# Altium footprint library EXTRA.PcbLib: 19 footprints (part 1 of 2)
Each footprint in its own frame and in the unit in brackets; x right, y up, seen from the top. Pads: shape width x height; smd on the part's side, far side on the other; paste and mask are expansions set on the pad; w line width, h text height; cw(c..) or ccw(c..) is an arc to the next point about the centre after c.
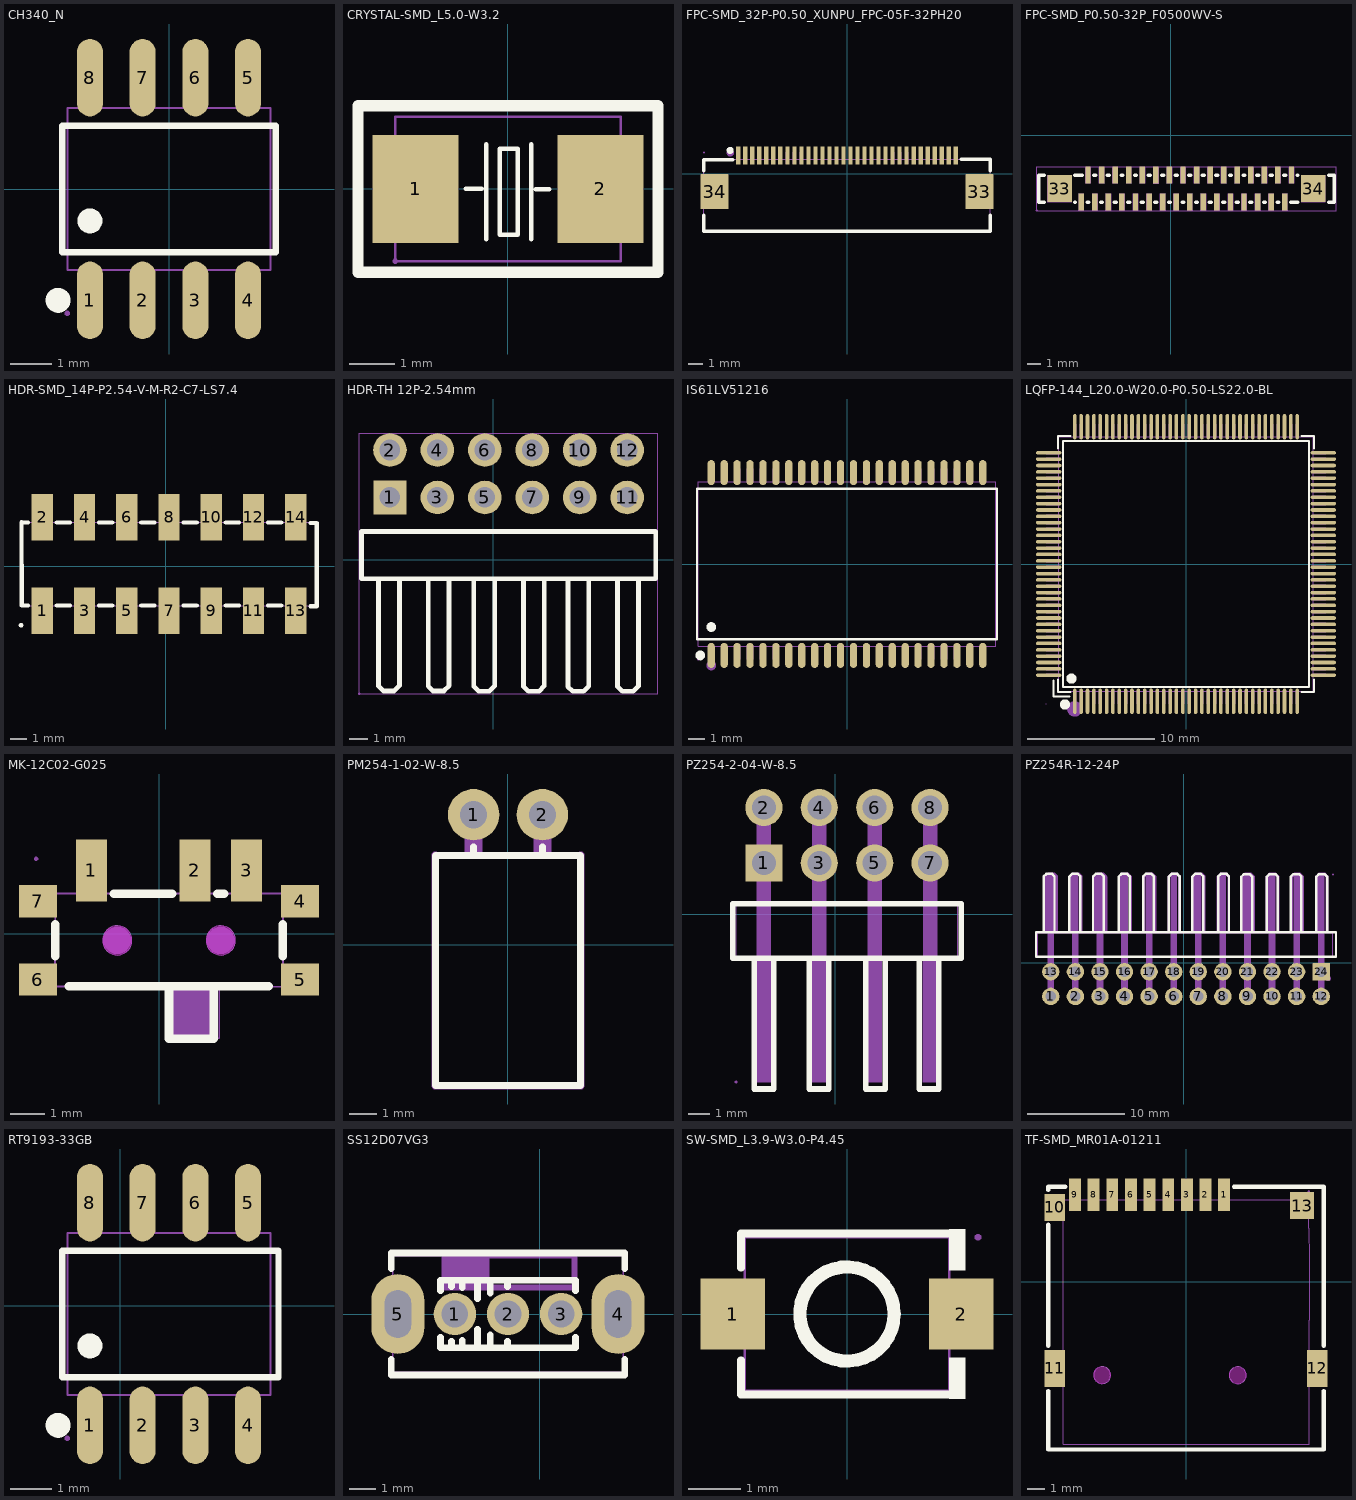
[diagram p0: the footprints below, top view; thin cyan lines are the x and y axes]

## CH340_N [mm] "USB转串口小封装芯片"
pads (8):
  oval 0.63x1.865 smd: 1(-1.905,-2.682) 2(-0.635,-2.682) 3(0.635,-2.682) 4(1.905,-2.682) 5(1.905,2.682) 6(0.635,2.682) 7(-0.635,2.682)
  oval 0.63x1.865 smd mask+0.102: 8(-1.905,2.682)
Top Overlay:
  circle w0.3: c-1.905,-0.769 r0.15
  circle w0.3: c-2.672,-2.682 r0.15
  lines w0.152: -2.576,-1.521 -2.576,1.521 2.576,1.521 2.576,-1.521 -2.576,-1.521
Mechanical 15:
  region: -2.39,-3 -2.39,-2.975 -2.425,-2.94 -2.475,-2.94 -2.51,-2.975 -2.51,-3 -2.51,-3.025 -2.475,-3.06 -2.425,-3.06 -2.39,-3.025
  region: 1.695,1.94 1.695,2.175 2.115,2.175 2.115,1.94
  region: 1.695,2.165 1.695,3 2.115,3 2.115,2.165
  region: 0.425,1.94 0.425,2.175 0.845,2.175 0.845,1.94
  region: 0.425,2.165 0.425,3 0.845,3 0.845,2.165
  region: -0.845,1.94 -0.845,2.175 -0.425,2.175 -0.425,1.94
  region: -0.845,2.165 -0.845,3 -0.425,3 -0.425,2.165
  region: -2.115,1.94 -2.115,2.175 -1.695,2.175 -1.695,1.94
  region: -2.115,2.165 -2.115,3 -1.695,3 -1.695,2.165
  region: 1.695,-2.175 1.695,-1.94 2.115,-1.94 2.115,-2.175
  region: 1.695,-3 1.695,-2.165 2.115,-2.165 2.115,-3
  region: 0.425,-2.175 0.425,-1.94 0.845,-1.94 0.845,-2.175
  region: 0.425,-3 0.425,-2.165 0.845,-2.165 0.845,-3
  region: -0.845,-2.175 -0.845,-1.94 -0.425,-1.94 -0.425,-2.175
  region: -0.845,-3 -0.845,-2.165 -0.425,-2.165 -0.425,-3
  region: -2.115,-2.175 -2.115,-1.94 -1.695,-1.94 -1.695,-2.175
  region: -2.115,-3 -2.115,-2.165 -1.695,-2.165 -1.695,-3
  lines w0.051: -2.45,-1.95 -2.45,1.95 2.45,1.95 2.45,-1.95 -2.45,-1.95
3D body "123.stp": height 1.67, standoff -0.05, extent -2.425,-2.94 2.39,3.06

## CRYSTAL-SMD_L5.0-W3.2 [mm] "8M 贴片晶振"
pads (2):
  rect 1.9x2.4 smd: 1(-2.05,0) 2(2.05,0)
Top Overlay:
  lines w0.1: -0.94,0 -0.584,0 ; -0.483,-1.109 -0.483,0.991 ; 0.517,-1.109 0.517,0.991 ; 0.617,-0.009 0.917,-0.009 ; -0.183,-1.009 0.217,-1.009 0.217,0.89 -0.183,0.89 -0.183,-1.009
  lines w0.254: -3.325,-1.85 -3.325,-0.7 -3.325,0.7 -3.325,1.85 3.325,1.85 3.325,0.7 3.325,-0.7 3.325,-1.85 -3.325,-1.85
Mechanical 15:
  region: 1.3,1 2.4,1 2.4,-1 1.3,-1
  region: -2.4,1 -1.3,1 -1.3,-1 -2.4,-1
  region: -2.44,-1.6 -2.44,-1.575 -2.475,-1.54 -2.525,-1.54 -2.56,-1.575 -2.56,-1.6 -2.56,-1.625 -2.525,-1.66 -2.475,-1.66 -2.44,-1.625
  lines w0.051: -2.5,-1.6 2.5,-1.6 2.5,1.6 -2.5,1.6 -2.5,-1.6
3D body "X1.stp": height 1.41, standoff -0.01, extent -2.5,-1.6 2.5,1.6

## FPC-SMD_32P-P0.50_XUNPU_FPC-05F-32PH20 [mm] "32pin FPC排线 弯针"
pads (34):
  rect 0.3x1.25 smd paste+0 mask+0.05: 1(-7.75,1.288) 2(-7.25,1.288) 3(-6.75,1.288) 4(-6.25,1.288) 5(-5.75,1.288) 6(-5.25,1.288) 7(-4.75,1.288) 8(-4.25,1.288) 9(-3.75,1.288) 10(-3.25,1.288) 11(-2.75,1.288) 12(-2.25,1.288) 13(-1.75,1.288) 14(-1.25,1.288) 15(-0.75,1.288) 16(-0.25,1.288) 17(0.25,1.288) 18(0.75,1.288) 19(1.25,1.288) 20(1.75,1.288) 21(2.25,1.288) 22(2.75,1.288) 23(3.25,1.288) 24(3.75,1.288) 25(4.25,1.288) 26(4.75,1.288) 27(5.25,1.288) 28(5.75,1.288) 29(6.25,1.288) 30(6.75,1.288) 31(7.25,1.288) 32(7.75,1.288)
  rect 2x2.5 smd paste+0 mask+0.05: 33(9.44,-1.288) 34(-9.44,-1.288)
Top Overlay:
  circle w0.254: c-8.327,1.651 r0.127
  lines w0.254: -10.2,-2.969 -10.2,-4.113 10.2,-4.113 10.2,-2.969 ; -10.2,0.194 -10.2,1 -8.131,1 ; 8.131,1.016 10.2,1.016 10.2,0.194
Mechanical 6:
  circle w0.254: c-8.317,1.471 r0.127
Mechanical 15:
  drawing of 39 lines, arcs and shapes, not listed
3D body "FPC.stp": height 2.01, standoff 0, extent -10.2,-4.113 10.2,1.287

## FPC-SMD_P0.50-32P_F0500WV-S [mm] "FPC_32PIN 直立"
height 0.508
pads (34):
  rect 0.4x1.25 smd paste+0 mask+0.051: 1(-6.607,-4.938) 2(-6.109,-2.936) 3(-5.609,-4.936) 4(-5.109,-2.936) 5(-4.609,-4.936) 6(-4.109,-2.936) 7(-3.609,-4.936) 8(-3.109,-2.936) 9(-2.609,-4.936) 10(-2.109,-2.936) 11(-1.609,-4.936) 12(-1.107,-2.938) 13(-0.609,-4.936) 14(-0.109,-2.936) 15(0.391,-4.936) 16(0.891,-2.936) 17(1.391,-4.936) 18(1.891,-2.936) 19(2.391,-4.936) 20(2.891,-2.936) 21(3.391,-4.936) 22(3.891,-2.936) 23(4.393,-4.938) 24(4.891,-2.936) 25(5.391,-4.936) 26(5.891,-2.936) 27(6.393,-4.938) 28(6.891,-2.936) 29(7.391,-4.936) 30(7.891,-2.936) 31(8.391,-4.936) 32(8.891,-2.936)
  rect 1.8x2 smd paste+0 mask+0.051: 33(-8.207,-3.938) 34(10.493,-3.938)
Top Overlay:
  lines w0.254: -9.338,-4.938 -9.757,-4.938 -9.757,-2.938 -9.338,-2.938 ; -7.076,-4.938 -7.038,-4.938 ; -7.076,-2.938 -6.54,-2.938 ; -6.176,-4.938 -6.04,-4.938 ; -5.678,-2.938 -5.54,-2.938 ; -5.178,-4.938 -5.04,-4.938 ; -4.678,-2.938 -4.54,-2.938 ; -4.178,-4.938 -4.04,-4.938 ; -3.678,-2.938 -3.54,-2.938 ; -3.178,-4.938 -3.04,-4.938 ; -2.678,-2.938 -2.54,-2.938 ; -2.178,-4.938 -2.04,-4.938 ; -1.678,-2.938 -1.538,-2.938 ; -1.178,-4.938 -1.04,-4.938 ; -0.676,-2.938 -0.54,-2.938 ; -0.178,-4.938 -0.04,-4.938 ; 0.322,-2.938 0.46,-2.938 ; 0.822,-4.938 0.96,-4.938 ; 1.322,-2.938 1.46,-2.938 ; 1.822,-4.938 1.96,-4.938 ; 2.322,-2.938 2.46,-2.938 ; 2.822,-4.938 2.96,-4.938 ; 3.322,-2.938 3.46,-2.938 ; 3.822,-4.938 3.962,-4.938 ; 4.322,-2.938 4.46,-2.938 ; 4.824,-4.938 4.96,-4.938 ; 5.322,-2.938 5.46,-2.938 ; 5.822,-4.938 5.962,-4.938 ; 6.322,-2.938 6.46,-2.938 ; 6.824,-4.938 6.96,-4.938 ; 7.322,-2.938 7.46,-2.938 ; 7.822,-4.938 7.96,-4.938 ; 8.322,-2.938 8.46,-2.938 ; 8.822,-4.938 9.362,-4.938 ; 9.322,-2.938 9.362,-2.938 ; 11.624,-4.938 12.043,-4.938 12.043,-2.938 11.624,-2.938
Mechanical 15:
  drawing of 39 lines, arcs and shapes, not listed

## HDR-SMD_14P-P2.54-V-M-R2-C7-LS7.4 [mm] "2.54mm 2x7p贴片排针"
pads (14):
  rect 1.27x2.8 smd paste+0 mask+0.05: 1(-7.433,-2.664) 2(-7.433,2.936) 3(-4.893,-2.664) 4(-4.893,2.936) 5(-2.353,-2.664) 6(-2.353,2.936) 7(0.187,-2.664) 8(0.187,2.936) 9(2.727,-2.664) 10(2.727,2.936) 11(5.267,-2.664) 12(5.267,2.936) 13(7.807,-2.664) 14(7.807,2.936)
Top Overlay:
  lines w0.254: -8.726,-3.547 -8.68,-3.547 ; -8.678,2.651 -8.673,-2.364 -8.299,-2.364 ; -8.673,2.651 -8.573,2.636 -8.299,2.636 ; -6.567,-2.364 -5.759,-2.364 ; -6.567,2.636 -5.759,2.636 ; -4.027,-2.364 -3.219,-2.364 ; -4.027,2.636 -3.219,2.636 ; -1.487,-2.364 -0.679,-2.364 ; -1.487,2.636 -0.679,2.636 ; 1.053,-2.364 1.861,-2.364 ; 1.053,2.636 1.861,2.636 ; 3.593,-2.364 4.401,-2.364 ; 3.593,2.636 4.401,2.636 ; 6.133,-2.364 6.941,-2.364 ; 6.133,2.636 6.941,2.636 ; 8.695,-2.403 9.076,-2.403 9.076,2.596 8.695,2.596
Mechanical 15:
  region: -8.643,-3.564 -8.643,-3.539 -8.678,-3.504 -8.728,-3.504 -8.763,-3.539 -8.763,-3.564 -8.763,-3.589 -8.728,-3.624 -8.678,-3.624 -8.643,-3.589
  region: -7.753,3.836 -7.113,3.836 -7.113,1.836 -7.753,1.836
  region: -5.213,3.836 -4.573,3.836 -4.573,1.836 -5.213,1.836
  region: -2.673,3.836 -2.033,3.836 -2.033,1.836 -2.673,1.836
  region: -0.133,3.836 0.507,3.836 0.507,1.836 -0.133,1.836
  region: 2.407,3.836 3.047,3.836 3.047,1.836 2.407,1.836
  region: 4.947,3.836 5.587,3.836 5.587,1.836 4.947,1.836
  region: 7.487,3.836 8.127,3.836 8.127,1.836 7.487,1.836
  region: 7.487,-1.564 8.127,-1.564 8.127,-3.564 7.487,-3.564
  region: 4.947,-1.564 5.587,-1.564 5.587,-3.564 4.947,-3.564
  region: 2.407,-1.564 3.047,-1.564 3.047,-3.564 2.407,-3.564
  region: -0.133,-1.564 0.507,-1.564 0.507,-3.564 -0.133,-3.564
  region: -2.673,-1.564 -2.033,-1.564 -2.033,-3.564 -2.673,-3.564
  region: -5.213,-1.564 -4.573,-1.564 -4.573,-3.564 -5.213,-3.564
  region: -7.753,-1.564 -7.113,-1.564 -7.113,-3.564 -7.753,-3.564
  lines w0.051: -8.703,-2.364 -8.703,2.636 9.077,2.636 9.077,-2.364 -8.703,-2.364

## HDR-TH 12P-2.54mm [mm] "上下6p弯曲排针"
pads (12):
  rect 1.778x1.8 hole 1.1: 1(-5.528,3.328)
  round 1.8 hole 1.1: 2(-5.528,5.868) 3(-2.988,3.328) 4(-2.988,5.868) 5(-0.448,3.328) 6(-0.448,5.868) 7(2.092,3.328) 8(2.092,5.868) 9(4.632,3.328) 10(4.632,5.868) 11(7.172,3.328) 12(7.172,5.868)
Top Overlay:
  lines w0.254: -6.135,-1.032 -6.135,-6.778 -5.881,-7.032 -5.297,-7.032 -5.018,-6.753 -5.018,-1.032 ; -3.478,-1.032 -3.478,-6.778 -3.224,-7.032 -2.64,-7.032 -2.36,-6.753 -2.36,-1.032 ; -1.038,-1.042 -1.038,-6.788 -0.784,-7.042 -0.2,-7.042 0.08,-6.763 0.08,-1.042 ; 1.62,-1.042 1.62,-6.788 1.874,-7.042 2.458,-7.042 2.737,-6.763 2.737,-1.042 ; 4.002,-1.052 4.002,-6.798 4.256,-7.052 4.84,-7.052 5.12,-6.773 5.12,-1.052 ; 6.659,-1.052 6.659,-6.798 6.913,-7.052 7.498,-7.052 7.777,-6.773 7.777,-1.052 ; -7.052,-1.032 -6.958,-1.032 8.696,-1.032 8.696,1.508 -7.052,1.508 -7.052,-1.032
Mechanical 15:
  drawing of 17 lines, arcs and shapes, not listed

## IS61LV51216 [mm] "TSOP-44_L18.4-W10.2-P0.80-LS11.8-BL"
pads (44):
  oval 0.448x1.551 smd: 1(-8.4,-5.656) 2(-7.6,-5.656) 3(-6.8,-5.656) 4(-6,-5.656) 5(-5.2,-5.656) 6(-4.4,-5.656) 7(-3.6,-5.656) 8(-2.8,-5.656) 9(-2,-5.656) 10(-1.2,-5.656) 11(-0.4,-5.656) 12(0.4,-5.656) 13(1.2,-5.656) 14(2,-5.656) 15(2.8,-5.656) 16(3.6,-5.656) 17(4.4,-5.656) 18(5.2,-5.656) 19(6,-5.656) 20(6.8,-5.656) 21(7.6,-5.656) 22(8.4,-5.656) 23(8.4,5.656) 24(7.6,5.656) 25(6.8,5.656) 26(6,5.656) 27(5.2,5.656) 28(4.4,5.656) 29(3.6,5.656) 30(2.8,5.656) 31(2,5.656) 32(1.2,5.656) 33(0.4,5.656) 34(-0.4,5.656) 35(-1.2,5.656) 36(-2,5.656) 37(-2.8,5.656) 38(-3.6,5.656) 39(-4.4,5.656) 40(-5.2,5.656) 41(-6,5.656) 42(-6.8,5.656) 43(-7.6,5.656) 44(-8.4,5.656)
Top Overlay:
  circle w0.3: c-9.076,-5.656 r0.15
  circle w0.3: c-8.4,-3.899 r0.15
  lines w0.152: -9.281,-4.651 9.281,-4.651 9.281,4.651 -9.281,4.651 -9.281,-4.651
Mechanical 6:
  circle w0.3: c-8.4,-6.28 r0.15
Mechanical 15:
  drawing of 93 lines, arcs and shapes, not listed
3D body "SRAM.stp": height 1.1, standoff 0, extent -9.205,-5.906 9.195,5.906

## LQFP-144_L20.0-W20.0-P0.50-LS22.0-BL [mm] "意法半导体主控芯片"
pads (144):
  oval 0.28x2 smd paste+0 mask+0.051: 1(-8.75,-10.8) 2(-8.25,-10.8) 3(-7.75,-10.8) 4(-7.25,-10.8) 5(-6.75,-10.8) 6(-6.25,-10.8) 7(-5.75,-10.8) 8(-5.25,-10.8) 9(-4.75,-10.8) 10(-4.25,-10.8) 11(-3.75,-10.8) 12(-3.25,-10.8) 13(-2.75,-10.8) 14(-2.25,-10.8) 15(-1.75,-10.8) 16(-1.25,-10.8) 17(-0.75,-10.8) 18(-0.25,-10.8) 19(0.25,-10.8) 20(0.75,-10.8) 21(1.25,-10.8) 22(1.75,-10.8) 23(2.25,-10.8) 24(2.75,-10.8) 25(3.25,-10.8) 26(3.75,-10.8) 27(4.25,-10.8) 28(4.75,-10.8) 29(5.25,-10.8) 30(5.75,-10.8) 31(6.25,-10.8) 32(6.75,-10.8) 33(7.25,-10.8) 34(7.75,-10.8) 35(8.25,-10.8) 36(8.75,-10.8) 73(8.75,10.8) 74(8.25,10.8) 75(7.75,10.8) 76(7.25,10.8) 77(6.75,10.8) 78(6.25,10.8) 79(5.75,10.8) 80(5.25,10.8) 81(4.75,10.8) 82(4.25,10.8) 83(3.75,10.8) 84(3.25,10.8) 85(2.75,10.8) 86(2.25,10.8) 87(1.75,10.8) 88(1.25,10.8) 89(0.75,10.8) 90(0.25,10.8) 91(-0.25,10.8) 92(-0.75,10.8) 93(-1.25,10.8) 94(-1.75,10.8) 95(-2.25,10.8) 96(-2.75,10.8) 97(-3.25,10.8) 98(-3.75,10.8) 99(-4.25,10.8) 100(-4.75,10.8) 101(-5.25,10.8) 102(-5.75,10.8) 103(-6.25,10.8) 104(-6.75,10.8) 105(-7.25,10.8) 106(-7.75,10.8) 107(-8.25,10.8) 108(-8.75,10.8)
  oval 2x0.28 smd paste+0 mask+0.051: 37(10.8,-8.75) 38(10.8,-8.25) 39(10.8,-7.75) 40(10.8,-7.25) 41(10.8,-6.75) 42(10.8,-6.25) 43(10.8,-5.75) 44(10.8,-5.25) 45(10.8,-4.75) 46(10.8,-4.25) 47(10.8,-3.75) 48(10.8,-3.25) 49(10.8,-2.75) 50(10.8,-2.25) 51(10.8,-1.75) 52(10.8,-1.25) 53(10.8,-0.75) 54(10.8,-0.25) 55(10.8,0.25) 56(10.8,0.75) 57(10.8,1.25) 58(10.8,1.75) 59(10.8,2.25) 60(10.8,2.75) 61(10.8,3.25) 62(10.8,3.75) 63(10.8,4.25) 64(10.8,4.75) 65(10.8,5.25) 66(10.8,5.75) 67(10.8,6.25) 68(10.8,6.75) 69(10.8,7.25) 70(10.8,7.75) 71(10.8,8.25) 72(10.8,8.75) 109(-10.8,8.75) 110(-10.8,8.25) 111(-10.8,7.75) 112(-10.8,7.25) 113(-10.8,6.75) 114(-10.8,6.25) 115(-10.8,5.75) 116(-10.8,5.25) 117(-10.8,4.75) 118(-10.8,4.25) 119(-10.8,3.75) 120(-10.8,3.25) 121(-10.8,2.75) 122(-10.8,2.25) 123(-10.8,1.75) 124(-10.8,1.25) 125(-10.8,0.75) 126(-10.8,0.25) 127(-10.8,-0.25) 128(-10.8,-0.75) 129(-10.8,-1.25) 130(-10.8,-1.75) 131(-10.8,-2.25) 132(-10.8,-2.75) 133(-10.8,-3.25) 134(-10.8,-3.75) 135(-10.8,-4.25) 136(-10.8,-4.75) 137(-10.8,-5.25) 138(-10.8,-5.75) 139(-10.8,-6.25) 140(-10.8,-6.75) 141(-10.8,-7.25) 142(-10.8,-7.75) 143(-10.8,-8.25) 144(-10.8,-8.75)
Top Overlay:
  circle w0.4: c-9.525,-11.049 r0.2
  circle w0.4: c-9.017,-9.017 r0.2
  lines w0.152: -10.414,-9.144 -10.414,-10.414 -9.144,-10.414 ; -10.076,-9.081 -10.076,-10.076 -9.08,-10.076 ; -10.076,9.08 -10.076,10.076 -9.08,10.076 ; 9.081,-10.076 10.076,-10.076 10.076,-9.081 ; 9.081,10.076 10.076,10.076 10.076,9.08 ; -9.671,-9.671 -9.671,9.671 9.671,9.671 9.671,-9.671 -9.671,-9.671
Mechanical 6:
  circle w0.6: c-8.75,-11.4 r0.3
Mechanical 15:
  drawing of 293 lines, arcs and shapes, not listed
3D body "456.stp": height 1.4, standoff -0.1, extent -11.026,-11.01 10.974,10.99

## MK-12C02-G025 [mm] "贴片拨动开关"
pads (7):
  rect 0.9x1.8 smd: 1(-1.964,1.835) 2(1.036,1.835) 3(2.536,1.835)
  rect 1.1x0.93 smd: 4(4.086,0.939) 5(4.086,-1.331) 6(-3.514,-1.331) 7(-3.514,0.939)
Top Overlay:
  lines w0.254: -3.014,-0.658 -3.014,0.266 ; -2.614,-1.524 3.175,-1.524 ; -1.306,1.154 0.378,1.154 ; 0.286,-1.546 0.286,-3.046 1.586,-3.046 1.586,-1.546 ; 1.694,1.154 1.878,1.154 ; 3.586,-0.658 3.586,0.266
Keep-Out Layer:
  board cut-out: -0.789,-0.196 -0.789,-0.112 -0.854,0.044 -0.973,0.164 -1.13,0.229 -1.299,0.229 -1.455,0.164 -1.574,0.044 -1.639,-0.112 -1.639,-0.196 -1.639,-0.281 -1.574,-0.437 -1.455,-0.557 -1.299,-0.621 -1.129,-0.621 -0.973,-0.557 -0.854,-0.437 -0.789,-0.281
  board cut-out: 2.211,-0.196 2.211,-0.112 2.146,0.044 2.027,0.164 1.87,0.229 1.701,0.229 1.545,0.164 1.426,0.044 1.361,-0.112 1.361,-0.196 1.361,-0.281 1.426,-0.437 1.545,-0.557 1.701,-0.621 1.87,-0.621 2.027,-0.557 2.146,-0.437 2.211,-0.281
Mechanical 1:
  circle w0.005: c-1.214,-0.196 r0.425
  circle w0.005: c1.786,-0.196 r0.425
Mechanical 6:
  circle w0.4: c1.786,-0.196 r0.2
  circle w0.4: c-1.214,-0.196 r0.2
  region: 0.386,-1.548 0.386,-3.048 1.686,-3.048 1.686,-1.548
Mechanical 15:
  region: 3.542,-1.546 3.542,-1.116 4.142,-1.116 4.142,-1.546
  region: 3.542,0.724 3.542,1.154 4.142,1.154 4.142,0.724
  region: -3.567,-1.546 -3.567,-1.116 -2.967,-1.116 -2.967,-1.546
  region: -3.567,0.724 -3.567,1.154 -2.967,1.154 -2.967,0.724
  region: 2.736,0.965 2.336,0.965 2.336,2.165 2.736,2.165
  region: 1.236,0.965 0.836,0.965 0.836,2.165 1.236,2.165
  region: -1.764,0.965 -2.164,0.965 -2.164,2.165 -1.764,2.165
  region: -3.507,2.165 -3.507,2.189 -3.542,2.223 -3.591,2.223 -3.626,2.189 -3.627,2.165 -3.626,2.141 -3.591,2.107 -3.542,2.107 -3.507,2.141
  lines w0.051: -3.017,-1.537 -3.017,-1.372 -3.014,1.165 3.591,1.165 3.591,-1.541 1.743,-1.541 1.743,-3.037 0.445,-3.037 0.445,-1.537 -3.017,-1.537
Multi-Layer keep-out:
  region: -0.789,-0.196 -0.789,-0.112 -0.854,0.044 -0.973,0.164 -1.13,0.229 -1.299,0.229 -1.455,0.164 -1.574,0.044 -1.639,-0.112 -1.639,-0.196 -1.639,-0.281 -1.574,-0.437 -1.455,-0.557 -1.299,-0.621 -1.129,-0.621 -0.973,-0.557 -0.854,-0.437 -0.789,-0.281
  region: 2.211,-0.196 2.211,-0.112 2.146,0.044 2.027,0.164 1.87,0.229 1.701,0.229 1.545,0.164 1.426,0.044 1.361,-0.112 1.361,-0.196 1.361,-0.281 1.426,-0.437 1.545,-0.557 1.701,-0.621 1.87,-0.621 2.027,-0.557 2.146,-0.437 2.211,-0.281
3D body "MK.stp": height 1.4, standoff -0.5, extent -3.469,-2.78 4.231,2.42

## PM254-1-02-W-8.5 [mm] "2p 弯针"
pads (2):
  round 1.9 hole 1 paste+0 mask+0.05: 1(-1.257,4.793) 2(1.283,4.793)
Top Overlay:
  lines w0.254: -1.257,3.293 -1.257,3.612 ; -2.667,-5.207 2.693,-5.207 2.693,3.293 -2.667,3.293 -2.667,-5.207 ; 1.283,3.293 1.283,3.612 1.283,3.293
Mechanical 6:
  region: -2.667,-5.08 2.693,-5.08 2.746,-5.08 2.82,-5.154 2.82,-5.26 2.746,-5.334 2.693,-5.334 -2.667,-5.334 -2.72,-5.334 -2.794,-5.26 -2.794,-5.154 -2.72,-5.08
  region: 2.82,3.293 2.82,-5.207 2.82,-5.26 2.746,-5.334 2.64,-5.334 2.566,-5.26 2.566,-5.207 2.566,3.293 2.566,3.346 2.64,3.42 2.746,3.42 2.82,3.346
  region: -2.54,3.293 -2.54,-5.207 -2.54,-5.26 -2.614,-5.334 -2.72,-5.334 -2.794,-5.26 -2.794,-5.207 -2.794,3.293 -2.794,3.346 -2.72,3.42 -2.614,3.42 -2.54,3.346
Mechanical 15:
  region: -2.667,-5.207 -2.667,-5.182 -2.702,-5.147 -2.752,-5.147 -2.787,-5.182 -2.787,-5.207 -2.787,-5.232 -2.752,-5.267 -2.702,-5.267 -2.667,-5.232
  region: 1.603,4.993 0.963,4.993 0.963,3.283 1.603,3.283
  region: -0.937,4.993 -1.577,4.993 -1.577,3.283 -0.937,3.283
  region: -1.577,4.993 -0.937,4.993 -0.937,4.593 -1.577,4.593
  region: 0.963,4.993 1.603,4.993 1.603,4.593 0.963,4.593
  lines w0.051: -2.727,-5.207 -2.727,3.293 2.753,3.293 2.753,-5.207 -2.727,-5.207
3D body "3333D_.stp": height 2.5, standoff -3.2, extent -2.745,-5.149 2.745,5.001

## PZ254-2-04-W-8.5 [mm] "2.54mm 2x4p 弯针"
pads (8):
  rect 1.7x1.7 hole 1.1 paste+0 mask+0.05: 1(-3.279,2.359)
  round 1.7 hole 1.1 paste+0 mask+0.05: 2(-3.279,4.899) 3(-0.739,2.359) 4(-0.739,4.899) 5(1.801,2.359) 6(1.801,4.899) 7(4.341,2.359) 8(4.341,4.899)
Top Overlay:
  lines w0.254: -3.723,-2.001 -3.723,-8.001 -2.829,-8.001 -2.829,-2.001 ; -1.209,-2.001 -1.209,-8.001 -0.314,-8.001 -0.314,-2.001 ; 1.382,-2.001 1.382,-8.001 2.277,-8.001 2.277,-2.001 ; 3.846,-2.001 3.846,-8.001 4.74,-8.001 4.74,-2.001 ; -4.699,-2.001 5.761,-2.001 5.761,0.499 -4.699,0.499 -4.699,-2.001
Mechanical 6:
  region: 4.004,-2.044 4.658,-2.044 4.658,-7.698 4.004,-7.698
  region: 1.464,-2.044 2.118,-2.044 2.118,-7.698 1.464,-7.698
  region: -1.076,-2.044 -0.422,-2.044 -0.422,-7.698 -1.076,-7.698
  region: -3.616,-2.044 -2.962,-2.044 -2.962,-7.698 -3.616,-7.698
Mechanical 15:
  region: -4.489,-7.681 -4.489,-7.656 -4.524,-7.621 -4.574,-7.621 -4.609,-7.656 -4.609,-7.681 -4.609,-7.706 -4.574,-7.741 -4.524,-7.741 -4.489,-7.706
  region: 4.021,5.219 4.661,5.219 4.661,4.579 4.021,4.579
  region: 4.021,2.679 4.661,2.679 4.661,2.039 4.021,2.039
  region: 1.481,5.219 2.121,5.219 2.121,4.579 1.481,4.579
  region: 1.481,2.679 2.121,2.679 2.121,2.039 1.481,2.039
  region: -1.059,5.219 -0.419,5.219 -0.419,4.579 -1.059,4.579
  region: -1.059,2.679 -0.419,2.679 -0.419,2.039 -1.059,2.039
  region: -3.599,5.219 -2.959,5.219 -2.959,4.579 -3.599,4.579
  region: -3.599,2.679 -2.959,2.679 -2.959,2.039 -3.599,2.039
  region: 4.021,-7.681 4.021,5.219 4.661,5.219 4.661,-7.681
  region: 1.481,-7.681 1.481,5.219 2.121,5.219 2.121,-7.681
  region: -1.059,-7.681 -1.059,5.219 -0.419,5.219 -0.419,-7.681
  region: -3.599,-7.681 -3.599,5.219 -2.959,5.219 -2.959,-7.681
  lines w0.051: -4.549,-2.001 -4.549,0.499 5.611,0.499 5.611,-2.001 -4.549,-2.001
3D body "2x4p.stp": height 5, standoff -3, extent -4.572,-7.567 5.598,5.333

## PZ254R-12-24P [mm] "2X12P 弯针"
pads (24):
  round 1.8 hole 1.1: 1(-13.716,-3.476) 2(-11.176,-3.476) 3(-8.636,-3.476) 4(-6.096,-3.476) 5(-3.556,-3.476) 6(-1.016,-3.476) 7(1.524,-3.476) 8(4.064,-3.476) 9(6.604,-3.476) 10(9.144,-3.476) 11(11.684,-3.476) 12(14.224,-3.476) 13(-13.716,-0.936) 14(-11.176,-0.936) 15(-8.636,-0.936) 16(-6.096,-0.936) 17(-3.556,-0.936) 18(-1.016,-0.936) 19(1.524,-0.936) 20(4.064,-0.936) 21(6.604,-0.936) 22(9.144,-0.936) 23(11.684,-0.936)
  rect 1.778x1.8 hole 1.1: 24(14.224,-0.936)
Top Overlay:
  lines w0.254: -14.449,3.174 -14.449,8.894 -14.169,9.174 -13.585,9.174 -13.331,8.92 -13.331,3.174 ; -11.791,3.174 -11.791,8.894 -11.512,9.174 -10.928,9.174 -10.674,8.92 -10.674,3.174 ; -9.351,3.164 -9.351,8.885 -9.072,9.164 -8.487,9.164 -8.233,8.91 -8.233,3.164 ; -6.694,3.164 -6.694,8.885 -6.414,9.164 -5.83,9.164 -5.576,8.91 -5.576,3.164 ; -4.179,3.174 -4.179,8.894 -3.899,9.174 -3.315,9.174 -3.061,8.92 -3.061,3.174 ; -1.521,3.174 -1.521,8.894 -1.242,9.174 -0.658,9.174 -0.404,8.92 -0.404,3.174 ; 0.919,3.164 0.919,8.885 1.198,9.164 1.783,9.164 2.037,8.91 2.037,3.164 ; 3.576,3.164 3.576,8.885 3.856,9.164 4.44,9.164 4.694,8.91 4.694,3.164 ; 5.959,3.154 5.959,8.875 6.238,9.154 6.822,9.154 7.076,8.9 7.076,3.154 ; 8.616,3.154 8.616,8.875 8.896,9.154 9.48,9.154 9.734,8.9 9.734,3.154 ; 11.056,3.144 11.056,8.864 11.336,9.144 11.92,9.144 12.174,8.89 12.174,3.144 ; 13.714,3.144 13.714,8.864 13.993,9.144 14.577,9.144 14.831,8.89 14.831,3.144 ; -15.24,0.604 15.748,0.604 15.748,3.144 15.654,3.144 -15.24,3.144 -15.24,0.604
Mechanical 6:
  drawing of 13 lines, arcs and shapes, not listed
Mechanical 15:
  drawing of 41 lines, arcs and shapes, not listed
3D body "2x12p.stp": height 5, standoff -3, extent -15.09,-3.903 15.4,8.997

## RT9193-33GB [mm] "5vת3v3-LDOоƬ"
pads (8):
  oval 0.63x1.865 smd: 1(-0.734,-2.878) 2(0.536,-2.878) 3(1.806,-2.878) 4(3.076,-2.878) 5(3.076,2.487) 6(1.806,2.487) 7(0.536,2.487)
  oval 0.63x1.865 smd mask+0.102: 8(-0.734,2.487)
Top Overlay:
  circle w0.3: c-1.501,-2.878 r0.15
  circle w0.3: c-0.734,-0.964 r0.15
  lines w0.152: -1.405,-1.716 3.81,-1.716 3.81,1.326 -1.405,1.326 -1.405,-1.716
Mechanical 15:
  region: -0.944,-3.195 -0.944,-2.36 -0.524,-2.36 -0.524,-3.195
  region: -0.944,-2.37 -0.944,-2.135 -0.524,-2.135 -0.524,-2.37
  region: 0.326,-3.195 0.326,-2.36 0.746,-2.36 0.746,-3.195
  region: 0.326,-2.37 0.326,-2.135 0.746,-2.135 0.746,-2.37
  region: 1.596,-3.195 1.596,-2.36 2.016,-2.36 2.016,-3.195
  region: 1.596,-2.37 1.596,-2.135 2.016,-2.135 2.016,-2.37
  region: 2.866,-3.195 2.866,-2.36 3.286,-2.36 3.286,-3.195
  region: 2.866,-2.37 2.866,-2.135 3.286,-2.135 3.286,-2.37
  region: -0.944,1.97 -0.944,2.805 -0.524,2.805 -0.524,1.97
  region: -0.944,1.745 -0.944,1.98 -0.524,1.98 -0.524,1.745
  region: 0.326,1.97 0.326,2.805 0.746,2.805 0.746,1.97
  region: 0.326,1.745 0.326,1.98 0.746,1.98 0.746,1.745
  region: 1.596,1.97 1.596,2.805 2.016,2.805 2.016,1.97
  region: 1.596,1.745 1.596,1.98 2.016,1.98 2.016,1.745
  region: 2.866,1.97 2.866,2.805 3.286,2.805 3.286,1.97
  region: 2.866,1.745 2.866,1.98 3.286,1.98 3.286,1.745
  region: -1.219,-3.195 -1.219,-3.17 -1.254,-3.135 -1.303,-3.135 -1.339,-3.17 -1.339,-3.195 -1.339,-3.22 -1.303,-3.255 -1.254,-3.255 -1.219,-3.22
  lines w0.051: -1.279,-2.145 3.621,-2.145 3.621,1.755 -1.279,1.755 -1.279,-2.145
3D body "123.stp": height 1.67, standoff -0.05, extent -1.194,-3.195 3.621,2.805

## SS12D07VG3 [mm] "直插拨片开关"
pads (5):
  round 1.6 hole 1: 1(-3.2,0.014) 2(-1.2,0.014) 3(0.8,0.014)
  oval 2x3 hole 1 slot 1.8 at 90 deg: 4(2.95,0.014) 5(-5.35,0.014)
Top Overlay:
  lines w0.254: -5.6,-1.701 -5.6,-2.286 3.2,-2.286 3.2,-1.701 ; -5.6,1.729 -5.6,2.314 3.2,2.314 3.2,1.729 ; -3.74,-0.864 -3.74,-1.256 1.34,-1.256 1.34,-0.864 ; -3.74,0.892 -3.74,1.284 1.34,1.284 1.34,0.892 ; -3.324,-1.256 -3.324,-1.01 ; -3.324,1.038 -3.324,1.284 ; -2.925,-1.256 -2.925,-0.98 ; -2.925,1.008 -2.925,1.284 ; -2.344,-1.256 -2.344,-0.559 ; -2.344,0.587 -2.344,1.284 ; -1.873,-1.256 -1.873,-0.767 ; -1.873,0.795 -1.873,1.284 ; -1.219,-1.256 -1.219,-1.017 ; -1.219,1.045 -1.219,1.284
Mechanical 6:
  region: -3.7,2.314 -3.7,0.914 1.3,0.914 1.4,0.914 1.4,1.014 1.4,2.314 1.2,2.314 1.2,1.114 -1.9,1.114 -1.9,2.314
  region: -1.9,2.114 -1.9,2.314 1.2,2.314 1.2,2.114
Mechanical 15:
  region: -5.49,-2.186 -5.49,-2.161 -5.525,-2.126 -5.575,-2.126 -5.61,-2.161 -5.61,-2.186 -5.61,-2.211 -5.575,-2.246 -5.525,-2.246 -5.49,-2.211
  region: -0.95,0.164 -0.95,-0.136 -1.45,-0.136 -1.45,0.164
  region: 1.05,0.164 1.05,-0.136 0.55,-0.136 0.55,0.164
  region: -2.95,0.164 -2.95,-0.136 -3.45,-0.136 -3.45,0.164
  region: -5.55,-0.586 -5.55,0.614 -5.15,0.614 -5.15,-0.586
  region: 2.75,-0.586 2.75,0.614 3.15,0.614 3.15,-0.586
  lines w0.051: -5.55,-2.186 -5.55,2.214 3.15,2.214 3.15,-2.186 -5.55,-2.186
3D body "123.stp": height 8.7, standoff -2.8, extent -5.67,-2.428 3.13,2.173

## SW-SMD_L3.9-W3.0-P4.45 [mm] "贴片轻触开关"
pads (2):
  rect 1.23x1.36 smd: 1(-2.185,0) 2(2.185,0)
Top Overlay:
  circle w0.254: c0,0 r0.9
  region: 1.95,1.617 1.95,0.832 2.255,0.832 2.255,1.617
  region: 1.95,-1.617 1.95,-0.832 2.255,-0.832 2.255,-1.617
  lines w0.152: -2.026,-0.883 -2.026,-1.541 2.026,-1.541 ; -2.026,0.883 -2.026,1.541 2.026,1.541
Mechanical 15:
  region: -2.5,0.65 -2.5,-0.65 -1.6,-0.65 -1.6,0.65
  region: 2.5,0.65 2.5,-0.65 1.6,-0.65 1.6,0.65
  region: 2.56,1.465 2.56,1.49 2.525,1.525 2.475,1.525 2.44,1.49 2.44,1.465 2.44,1.44 2.475,1.405 2.525,1.405 2.56,1.44
  lines w0.051: -1.95,-1.465 -1.95,1.465 1.95,1.465 1.95,-1.465 -1.95,-1.465
3D body "SW.stp": height 1.95, standoff 0, extent -2.4,-1.45 2.4,1.45

## TF-SMD_MR01A-01211 [mm] "SD卡卡座"
height 0.508
pads (13):
  rect 0.7x1.9 smd paste+0 mask+0.051: 1(2.25,5.125) 2(1.15,5.125) 3(0.05,5.125) 4(-1.05,5.125) 5(-2.15,5.125) 6(-3.25,5.125) 7(-4.35,5.125) 8(-5.45,5.125) 9(-6.55,5.125)
  rect 1.2x1.6 smd paste+0 mask+0.051: 10(-7.75,4.375)
  rect 1.2x2.2 smd paste+0 mask+0.051: 11(-7.75,-5.125) 12(7.75,-5.125)
  rect 1.4x1.6 smd paste+0 mask+0.051: 13(6.85,4.475)
Top Overlay:
  lines w0.254: -8.128,-6.456 -8.128,-9.906 8.128,-9.906 8.128,-6.456 ; -8.128,-3.794 -8.128,3.344 ; -8.128,5.406 -8.128,5.588 -7.131,5.588 ; 2.831,5.588 8.128,5.588 8.128,-3.794
Keep-Out Layer:
  board cut-out: -4.45,-5.525 -4.45,-5.425 -4.526,-5.242 -4.667,-5.101 -4.85,-5.025 -5.049,-5.025 -5.233,-5.101 -5.374,-5.242 -5.45,-5.425 -5.45,-5.525 -5.45,-5.624 -5.374,-5.808 -5.233,-5.949 -5.049,-6.025 -4.85,-6.025 -4.667,-5.949 -4.526,-5.808 -4.45,-5.624
  board cut-out: 3.55,-5.527 3.55,-5.428 3.474,-5.244 3.333,-5.104 3.15,-5.027 2.951,-5.027 2.767,-5.104 2.626,-5.244 2.55,-5.428 2.55,-5.527 2.55,-5.627 2.626,-5.811 2.767,-5.951 2.951,-6.027 3.15,-6.027 3.333,-5.951 3.474,-5.811 3.55,-5.627
Mechanical 1:
  circle w0.005: c-4.95,-5.525 r0.5
  circle w0.005: c3.05,-5.527 r0.5
Mechanical 15:
  region: 7.314,5.314 7.314,5.338 7.279,5.374 7.23,5.374 7.194,5.338 7.194,5.314 7.194,5.289 7.23,5.254 7.279,5.254 7.314,5.289
  region: -6.7,5.312 -6.4,5.312 -6.4,4.812 -6.7,4.812
  region: -5.6,5.312 -5.3,5.312 -5.3,4.812 -5.6,4.812
  region: -4.5,5.312 -4.2,5.312 -4.2,4.812 -4.5,4.812
  region: -3.4,5.312 -3.1,5.312 -3.1,4.812 -3.4,4.812
  region: -2.3,5.312 -2,5.312 -2,4.812 -2.3,4.812
  region: -1.2,5.312 -0.9,5.312 -0.9,4.812 -1.2,4.812
  region: -0.1,5.312 0.2,5.312 0.2,4.812 -0.1,4.812
  region: 1,5.312 1.3,5.312 1.3,4.812 1,4.812
  region: 2.1,5.312 2.4,5.312 2.4,4.812 2.1,4.812
  region: -8.086,-4.525 -7.236,-4.525 -7.236,-5.725 -8.086,-5.725
  region: 7.2,-4.5 8.05,-4.5 8.05,-5.7 7.2,-5.7
  region: -8.086,4.875 -7.236,4.875 -7.236,3.875 -8.086,3.875
  region: 7.275,4.975 7.275,3.975 6.425,3.975 6.425,4.975
  lines w0.051: -7.239,-9.599 -7.239,4.826 0.1,4.826 3.769,4.826 7.261,4.826 7.251,3.14 7.267,1.328 7.274,-2.272 7.261,-9.599 -7.239,-9.599
3D body "SD.stp": height 2.05, standoff -0.6, extent -8.128,-9.594 8.022,5.406